# Altium footprint library CONN_HDR_1.27MM_ST_SMD.PcbLib: 118 footprints (part 1 of 8)
Each footprint in its own frame and in the unit in brackets; x right, y up, seen from the top. Pads: shape width x height; smd on the part's side, far side on the other; paste and mask are expansions set on the pad; w line width, h text height; cw(c..) or ccw(c..) is an arc to the next point about the centre after c.
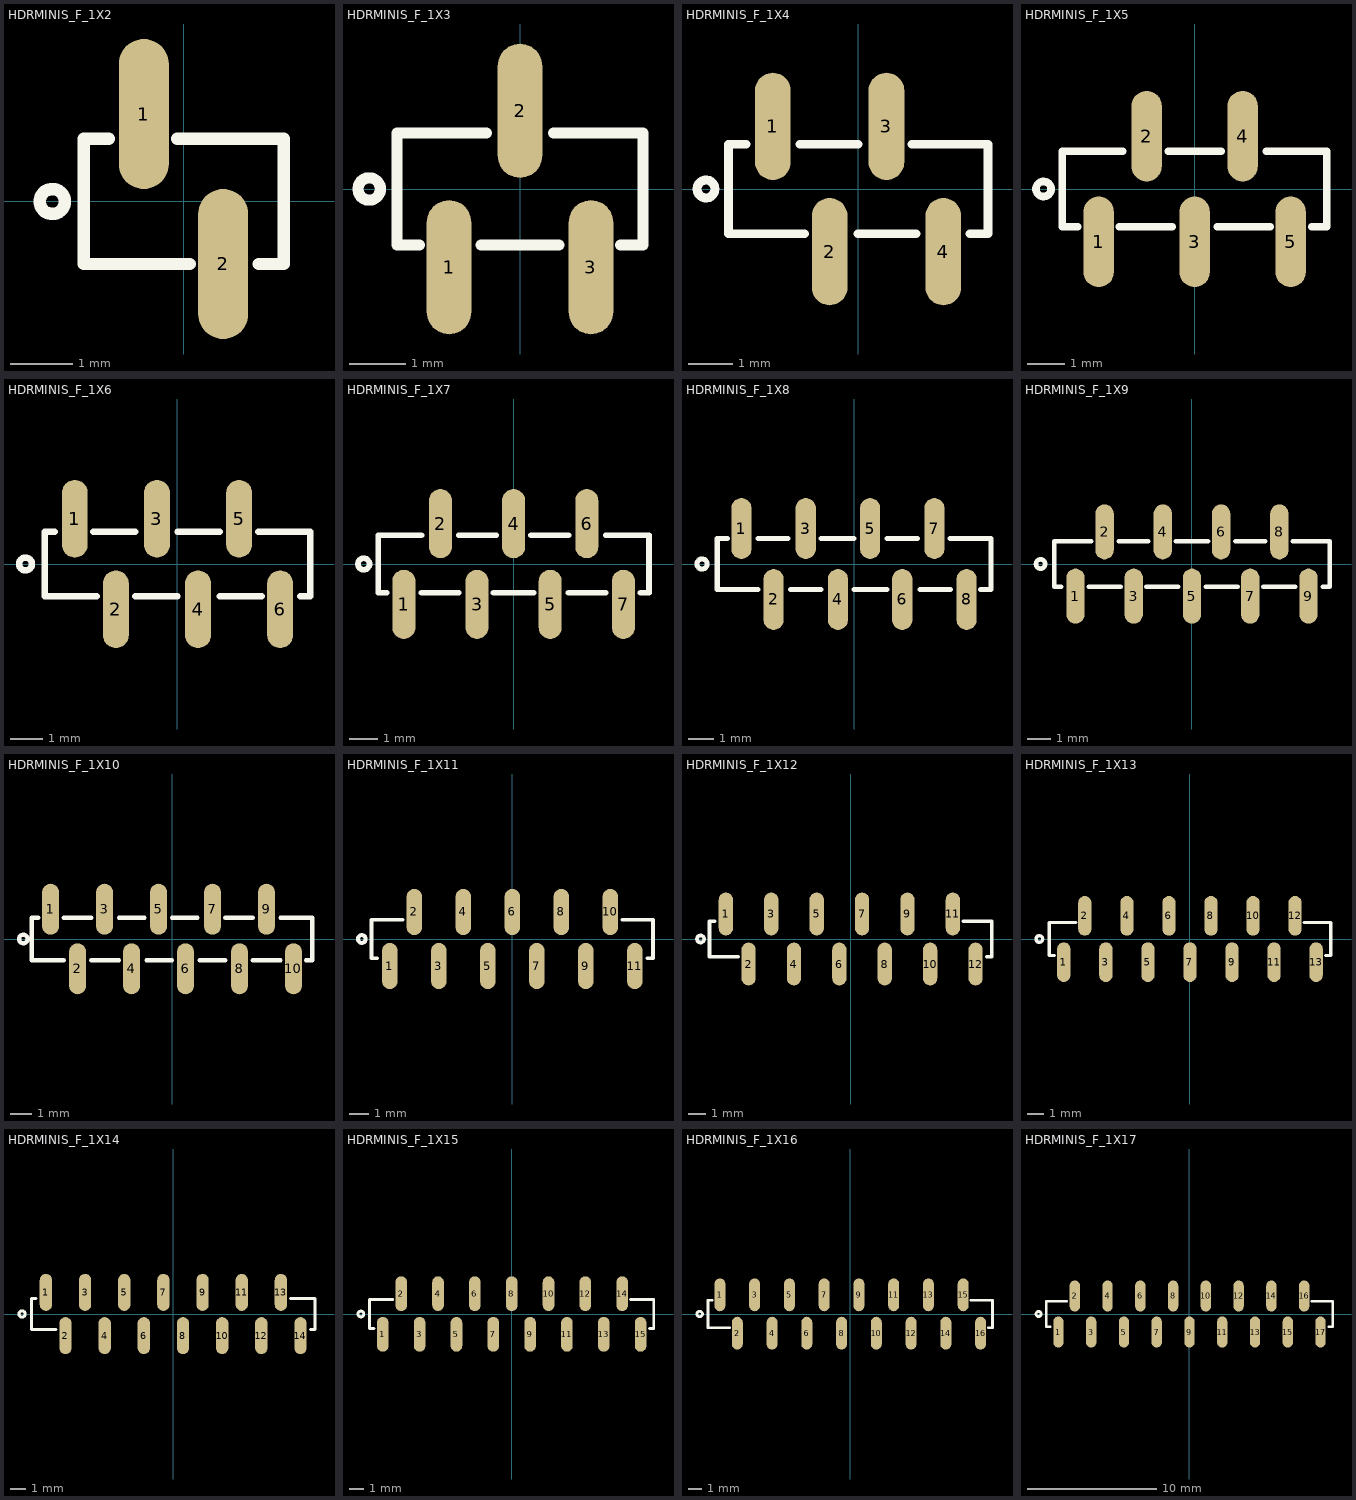
[diagram p0: the footprints below, top view; thin cyan lines are the x and y axes]

## HDRMINIS_F_1X2 [mm] "mini header (50mil pitch)"
pads (2):
  oval 0.8x2.4 smd mask+0.1: 1(-0.635,1.4) 2(0.635,-1)
Top Overlay:
  circle w0.2: c-2.1,0 r0.2
  lines w0.2: -1.2,1 -1.6,1 -1.6,-1 0.1,-1 ; -0.1,1 1.6,1 1.6,-1 1.2,-1
3D body "a-bl127-eg-z02mr1.step": height 4.65, standoff 0.05, extent -1.47,-1.6 1.47,1.6

## HDRMINIS_F_1X3 [mm] "mini header (50mil pitch)"
pads (3):
  oval 0.8x2.4 smd mask+0.1: 1(-1.27,-1.4) 2(0,1.4) 3(1.27,-1.4)
Top Overlay:
  circle w0.2: c-2.7,0 r0.2
  lines w0.2: -1.8,-1 -2.2,-1 -2.2,1 -0.6,1 ; -0.7,-1 0.7,-1 ; 0.6,1 2.2,1 2.2,-1 1.8,-1
3D body "a-bl127-eg-z03mr1.stp": height 4.65, standoff 0.05, extent -2.105,-1.6 2.105,1.6

## HDRMINIS_F_1X4 [mm] "mini header (50mil pitch)"
pads (4):
  oval 0.8x2.4 smd mask+0.1: 1(-1.905,1.4) 2(-0.635,-1.4) 3(0.635,1.4) 4(1.905,-1.4)
Top Overlay:
  circle w0.2: c-3.4,0 r0.2
  lines w0.2: -2.5,1 -2.9,1 -2.9,-1 -1.2,-1 ; -1.3,1 0,1 ; 0,-1 1.3,-1 ; 1.2,1 2.9,1 2.9,-1 2.5,-1
3D body "a-bl127-eg-z04mr1.stp": height 4.65, standoff 0.05, extent -2.74,-1.6 2.74,1.6

## HDRMINIS_F_1X5 [mm] "mini header (50mil pitch)"
pads (5):
  oval 0.8x2.4 smd mask+0.1: 1(-2.54,-1.4) 2(-1.27,1.4) 3(0,-1.4) 4(1.27,1.4) 5(2.54,-1.4)
Top Overlay:
  circle w0.2: c-4,0 r0.2
  lines w0.2: -3.1,-1 -3.5,-1 -3.5,1 -1.9,1 ; -2,-1 -0.6,-1 ; -0.7,1 0.7,1 ; 0.6,-1 2,-1 ; 1.9,1 3.5,1 3.5,-1 3.1,-1
3D body "a-bl127-eg-z05mr1.stp": height 4.65, standoff 0.05, extent -3.375,-1.6 3.375,1.6

## HDRMINIS_F_1X6 [mm] "mini header (50mil pitch)"
pads (6):
  oval 0.8x2.4 smd mask+0.1: 1(-3.175,1.4) 2(-1.905,-1.4) 3(-0.635,1.4) 4(0.635,-1.4) 5(1.905,1.4) 6(3.175,-1.4)
Top Overlay:
  circle w0.2: c-4.7,0 r0.2
  lines w0.2: -3.8,1 -4.1,1 -4.1,-1 -2.5,-1 ; -2.6,1 -1.3,1 ; -1.3,-1 0,-1 ; 0,1 1.3,1 ; 1.3,-1 2.6,-1 ; 2.5,1 4.1,1 4.1,-1 3.8,-1
3D body "a-bl127-eg-z06mp1.stp": height 4.65, standoff 0.05, extent -4.01,-1.6 4.01,1.6

## HDRMINIS_F_1X7 [mm] "mini header (50mil pitch)"
pads (7):
  oval 0.8x2.4 smd mask+0.1: 1(-3.81,-1.4) 2(-2.54,1.4) 3(-1.27,-1.4) 4(0,1.4) 5(1.27,-1.4) 6(2.54,1.4) 7(3.81,-1.4)
Top Overlay:
  circle w0.2: c-5.2,0 r0.2
  lines w0.2: -4.4,-1 -4.7,-1 -4.7,1 -3.2,1 ; -3.2,-1 -1.9,-1 ; -1.9,1 -0.6,1 ; -0.7,-1 0.7,-1 ; 0.6,1 1.9,1 ; 1.9,-1 3.2,-1 ; 3.2,1 4.7,1 4.7,-1 4.4,-1
3D body "a-bl127-eg-z07mr1.stp": height 4.65, standoff 0.05, extent -4.645,-1.6 4.645,1.6

## HDRMINIS_F_1X8 [mm] "mini header (50mil pitch)"
pads (8):
  oval 0.8x2.4 smd mask+0.1: 1(-4.445,1.4) 2(-3.175,-1.4) 3(-1.905,1.4) 4(-0.635,-1.4) 5(0.635,1.4) 6(1.905,-1.4) 7(3.175,1.4) 8(4.445,-1.4)
Top Overlay:
  circle w0.2: c-6,0 r0.2
  lines w0.2: -5,1 -5.4,1 -5.4,-1 -3.8,-1 ; -3.8,1 -2.6,1 ; -2.5,-1 -1.3,-1 ; -1.3,1 0,1 ; 0,-1 1.3,-1 ; 1.3,1 2.5,1 ; 2.6,-1 3.8,-1 ; 3.8,1 5.4,1 5.4,-1 5,-1
3D body "a-bl127-eg-z08mr1.stp": height 4.65, standoff 0.05, extent -5.28,-1.6 5.28,1.6

## HDRMINIS_F_1X9 [mm] "mini header (50mil pitch)"
pads (9):
  oval 0.8x2.4 smd mask+0.1: 1(-5.08,-1.4) 2(-3.81,1.4) 3(-2.54,-1.4) 4(-1.27,1.4) 5(0,-1.4) 6(1.27,1.4) 7(2.54,-1.4) 8(3.81,1.4) 9(5.08,-1.4)
Top Overlay:
  circle w0.2: c-6.6,0 r0.2
  lines w0.2: -5.7,-1 -6,-1 -6,1 -4.4,1 ; -4.5,-1 -3.1,-1 ; -3.2,1 -1.9,1 ; -2,-1 -0.6,-1 ; -0.7,1 0.7,1 ; 0.6,-1 2,-1 ; 1.9,1 3.2,1 ; 3.1,-1 4.5,-1 ; 4.4,1 6,1 6,-1 5.7,-1
3D body "a-bl127-eg-z09mr1.stp": height 4.65, standoff 0.05, extent -5.915,-1.6 5.915,1.6

## HDRMINIS_F_1X10 [mm] "mini header (50mil pitch)"
pads (10):
  oval 0.8x2.4 smd mask+0.1: 1(-5.715,1.4) 2(-4.445,-1.4) 3(-3.175,1.4) 4(-1.905,-1.4) 5(-0.635,1.4) 6(0.635,-1.4) 7(1.905,1.4) 8(3.175,-1.4) 9(4.445,1.4) 10(5.715,-1.4)
Top Overlay:
  circle w0.2: c-7,0 r0.2
  lines w0.2: -6.3,1 -6.6,1 -6.6,-1 -5.1,-1 ; -5.1,1 -3.8,1 ; -3.8,-1 -2.5,-1 ; -2.5,1 -1.3,1 ; -1.2,-1 0,-1 ; 0,1 1.2,1 ; 1.3,-1 2.5,-1 ; 2.5,1 3.8,1 ; 3.8,-1 5.1,-1 ; 5.1,1 6.6,1 6.6,-1 6.3,-1
3D body "a-bl127-eg-z10mr1.stp": height 4.65, standoff 0.05, extent -6.55,-1.6 6.55,1.6

## HDRMINIS_F_1X11 [mm] "mini header (50mil pitch)"
pads (11):
  oval 0.8x2.4 smd mask+0.1: 1(-6.35,-1.4) 2(-5.08,1.4) 3(-3.81,-1.4) 4(-2.54,1.4) 5(-1.27,-1.4) 6(0,1.4) 7(1.27,-1.4) 8(2.54,1.4) 9(3.81,-1.4) 10(5.08,1.4) 11(6.35,-1.4)
Top Overlay:
  circle w0.2: c-7.8,0 r0.2
  lines w0.2: -7,-1 -7.3,-1 -7.3,1 -5.7,1 ; 5.7,1 7.3,1 7.3,-1 7,-1
3D body "a-bl127-eg-z03mr1.stp": height 4.65, standoff 0.05, extent -7.185,-1.6 -2.975,1.6
3D body "a-bl127-eg-z08mr1.stp": height 4.65, standoff 0.05, extent -3.375,-1.6 7.185,1.6

## HDRMINIS_F_1X12 [mm] "mini header (50mil pitch)"
pads (12):
  oval 0.8x2.4 smd mask+0.1: 1(-6.985,1.4) 2(-5.715,-1.4) 3(-4.445,1.4) 4(-3.175,-1.4) 5(-1.905,1.4) 6(-0.635,-1.4) 7(0.635,1.4) 8(1.905,-1.4) 9(3.175,1.4) 10(4.445,-1.4) 11(5.715,1.4) 12(6.985,-1.4)
Top Overlay:
  circle w0.2: c-8.4,0 r0.2
  lines w0.2: -7.6,1 -7.9,1 -7.9,-1 -6.3,-1 ; 6.3,1 7.9,1 7.9,-1 7.6,-1
3D body "a-bl127-eg-z02mr1.step": height 4.65, standoff 0.05, extent -7.82,-1.6 -4.88,1.6
3D body "a-bl127-eg-z02mr1.step": height 4.65, standoff 0.05, extent -5.28,-1.6 -2.34,1.6
3D body "a-bl127-eg-z02mr1.step": height 4.65, standoff 0.05, extent -2.74,-1.6 0.2,1.6
3D body "a-bl127-eg-z02mr1.step": height 4.65, standoff 0.05, extent -0.2,-1.6 2.74,1.6
3D body "a-bl127-eg-z02mr1.step": height 4.65, standoff 0.05, extent 2.34,-1.6 5.28,1.6
3D body "a-bl127-eg-z02mr1.step": height 4.65, standoff 0.05, extent 4.88,-1.6 7.82,1.6

## HDRMINIS_F_1X13 [mm] "mini header (50mil pitch)"
pads (13):
  oval 0.8x2.4 smd mask+0.1: 1(-7.62,-1.4) 2(-6.35,1.4) 3(-5.08,-1.4) 4(-3.81,1.4) 5(-2.54,-1.4) 6(-1.27,1.4) 7(0,-1.4) 8(1.27,1.4) 9(2.54,-1.4) 10(3.81,1.4) 11(5.08,-1.4) 12(6.35,1.4) 13(7.62,-1.4)
Top Overlay:
  circle w0.2: c-9.1,0 r0.2
  lines w0.2: -8.2,-1 -8.5,-1 -8.5,1 -6.9,1 ; 6.9,1 8.5,1 8.5,-1 8.2,-1
3D body "a-bl127-eg-z03mr1.stp": height 4.65, standoff 0.05, extent -8.455,-1.6 -4.245,1.6
3D body "a-bl127-eg-z02mr1.step": height 4.65, standoff 0.05, extent -4.645,-1.6 -1.705,1.6
3D body "a-bl127-eg-z02mr1.step": height 4.65, standoff 0.05, extent -2.105,-1.6 0.835,1.6
3D body "a-bl127-eg-z02mr1.step": height 4.65, standoff 0.05, extent 0.435,-1.6 3.375,1.6
3D body "a-bl127-eg-z02mr1.step": height 4.65, standoff 0.05, extent 2.975,-1.6 5.915,1.6
3D body "a-bl127-eg-z02mr1.step": height 4.65, standoff 0.05, extent 5.515,-1.6 8.455,1.6

## HDRMINIS_F_1X14 [mm] "mini header (50mil pitch)"
pads (14):
  oval 0.8x2.4 smd mask+0.1: 1(-8.255,1.4) 2(-6.985,-1.4) 3(-5.715,1.4) 4(-4.445,-1.4) 5(-3.175,1.4) 6(-1.905,-1.4) 7(-0.635,1.4) 8(0.635,-1.4) 9(1.905,1.4) 10(3.175,-1.4) 11(4.445,1.4) 12(5.715,-1.4) 13(6.985,1.4) 14(8.255,-1.4)
Top Overlay:
  circle w0.2: c-9.8,0 r0.2
  lines w0.2: -8.9,1 -9.2,1 -9.2,-1 -7.6,-1 ; 7.6,1 9.2,1 9.2,-1 8.9,-1
3D body "a-bl127-eg-z02mr1.step": height 4.65, standoff 0.05, extent 6.15,-1.6 9.09,1.6
3D body "a-bl127-eg-z02mr1.step": height 4.65, standoff 0.05, extent 3.61,-1.6 6.55,1.6
3D body "a-bl127-eg-z02mr1.step": height 4.65, standoff 0.05, extent 1.07,-1.6 4.01,1.6
3D body "a-bl127-eg-z02mr1.step": height 4.65, standoff 0.05, extent -1.47,-1.6 1.47,1.6
3D body "a-bl127-eg-z02mr1.step": height 4.65, standoff 0.05, extent -4.01,-1.6 -1.07,1.6
3D body "a-bl127-eg-z02mr1.step": height 4.65, standoff 0.05, extent -6.55,-1.6 -3.61,1.6
3D body "a-bl127-eg-z02mr1.step": height 4.65, standoff 0.05, extent -9.09,-1.6 -6.15,1.6

## HDRMINIS_F_1X15 [mm] "mini header (50mil pitch)"
pads (15):
  oval 0.8x2.4 smd mask+0.1: 1(-8.89,-1.4) 2(-7.62,1.4) 3(-6.35,-1.4) 4(-5.08,1.4) 5(-3.81,-1.4) 6(-2.54,1.4) 7(-1.27,-1.4) 8(0,1.4) 9(1.27,-1.4) 10(2.54,1.4) 11(3.81,-1.4) 12(5.08,1.4) 13(6.35,-1.4) 14(7.62,1.4) 15(8.89,-1.4)
Top Overlay:
  circle w0.2: c-10.4,0 r0.2
  lines w0.2: -9.5,-1 -9.8,-1 -9.8,1 -8.2,1 ; 8.2,1 9.8,1 9.8,-1 9.5,-1
3D body "a-bl127-eg-z02mr1.step": height 4.65, standoff 0.05, extent 6.785,-1.6 9.725,1.6
3D body "a-bl127-eg-z02mr1.step": height 4.65, standoff 0.05, extent 4.245,-1.6 7.185,1.6
3D body "a-bl127-eg-z02mr1.step": height 4.65, standoff 0.05, extent 1.705,-1.6 4.645,1.6
3D body "a-bl127-eg-z02mr1.step": height 4.65, standoff 0.05, extent -0.835,-1.6 2.105,1.6
3D body "a-bl127-eg-z02mr1.step": height 4.65, standoff 0.05, extent -3.375,-1.6 -0.435,1.6
3D body "a-bl127-eg-z02mr1.step": height 4.65, standoff 0.05, extent -5.915,-1.6 -2.975,1.6
3D body "a-bl127-eg-z03mr1.stp": height 4.65, standoff 0.05, extent -9.725,-1.6 -5.515,1.6

## HDRMINIS_F_1X16 [mm] "mini header (50mil pitch)"
pads (16):
  oval 0.8x2.4 smd mask+0.1: 1(-9.525,1.4) 2(-8.255,-1.4) 3(-6.985,1.4) 4(-5.715,-1.4) 5(-4.445,1.4) 6(-3.175,-1.4) 7(-1.905,1.4) 8(-0.635,-1.4) 9(0.635,1.4) 10(1.905,-1.4) 11(3.175,1.4) 12(4.445,-1.4) 13(5.715,1.4) 14(6.985,-1.4) 15(8.255,1.4) 16(9.525,-1.4)
Top Overlay:
  circle w0.2: c-11,0 r0.2
  lines w0.2: -10.1,1 -10.4,1 -10.4,-1 -8.8,-1 ; 8.8,1 10.4,1 10.4,-1 10.1,-1
3D body "a-bl127-eg-z02mr1.step": height 4.65, standoff 0.05, extent 4.88,-1.6 7.82,1.6
3D body "a-bl127-eg-z02mr1.step": height 4.65, standoff 0.05, extent 7.42,-1.6 10.36,1.6
3D body "a-bl127-eg-z02mr1.step": height 4.65, standoff 0.05, extent 2.34,-1.6 5.28,1.6
3D body "a-bl127-eg-z02mr1.step": height 4.65, standoff 0.05, extent -0.2,-1.6 2.74,1.6
3D body "a-bl127-eg-z02mr1.step": height 4.65, standoff 0.05, extent -2.74,-1.6 0.2,1.6
3D body "a-bl127-eg-z02mr1.step": height 4.65, standoff 0.05, extent -5.28,-1.6 -2.34,1.6
3D body "a-bl127-eg-z02mr1.step": height 4.65, standoff 0.05, extent -7.82,-1.6 -4.88,1.6
3D body "a-bl127-eg-z02mr1.step": height 4.65, standoff 0.05, extent -10.36,-1.6 -7.42,1.6

## HDRMINIS_F_1X17 [mm] "mini header (50mil pitch)"
pads (17):
  oval 0.8x2.4 smd mask+0.1: 1(-10.16,-1.4) 2(-8.89,1.4) 3(-7.62,-1.4) 4(-6.35,1.4) 5(-5.08,-1.4) 6(-3.81,1.4) 7(-2.54,-1.4) 8(-1.27,1.4) 9(0,-1.4) 10(1.27,1.4) 11(2.54,-1.4) 12(3.81,1.4) 13(5.08,-1.4) 14(6.35,1.4) 15(7.62,-1.4) 16(8.89,1.4) 17(10.16,-1.4)
Top Overlay:
  circle w0.2: c-11.7,0 r0.2
  lines w0.2: -10.8,-1 -11.1,-1 -11.1,1 -9.5,1 ; 9.5,1 11.1,1 11.1,-1 10.8,-1
3D body "a-bl127-eg-z03mr1.stp": height 4.65, standoff 0.05, extent -10.995,-1.6 -6.785,1.6
3D body "a-bl127-eg-z02mr1.step": height 4.65, standoff 0.05, extent -7.185,-1.6 -4.245,1.6
3D body "a-bl127-eg-z02mr1.step": height 4.65, standoff 0.05, extent -4.645,-1.6 -1.705,1.6
3D body "a-bl127-eg-z02mr1.step": height 4.65, standoff 0.05, extent -2.105,-1.6 0.835,1.6
3D body "a-bl127-eg-z02mr1.step": height 4.65, standoff 0.05, extent 0.435,-1.6 3.375,1.6
3D body "a-bl127-eg-z02mr1.step": height 4.65, standoff 0.05, extent 2.975,-1.6 5.915,1.6
3D body "a-bl127-eg-z02mr1.step": height 4.65, standoff 0.05, extent 5.515,-1.6 8.455,1.6
3D body "a-bl127-eg-z02mr1.step": height 4.65, standoff 0.05, extent 8.055,-1.6 10.995,1.6